# Altium schematic symbol library Schlib.SchLib: 725 symbols (part 3 of 6) (continued)
## FTSH-110-01-L-D-RA
designator J?  (value not drawn)
Conn Unshrouded Header HDR 20 POS 1.27mm Solder RA Side Entry Thru-Hole Tube; Manufacturer: Samtec; Manufacturer Part Number: FTSH-110-01-L-D-RA; Number of Contacts: 20; Gender: Male; Connector Type: Male Pin; Pitch: 0.05inch; Supplier 1: Rs; RoHS: Yes; Category: Connectors; Stock 1: 33; Pricing 1: 1=4.88000, 25=3.39000, 100=3.28000, 250=3.19000, 500=3.11000 (GBP); Mount: Through Hole; Contact Plating: Gold; Contact Material: Bronze; Housing Color: Black; Housing Material: Polymer; Color: Black; Min Operating Temperature: -55°C; Max Operating Temperature: 125°C; Number of Rows: 2; Termination: Solder; Packaging: Rail/Tube; Orientation: Right Angle; Number of Positions: 20; Series: FTSH; Contact Type: Male Pin; Length: 12.7mm; Depth: 8.1mm; Row Spacing: 0.05inch; Contact Mating Length: 0.12inch; Radiation Hardening: No; RoHS Compliant: Yes; Reach SVHC Compliant: Yes; ComponentLink1URL: https://datasheet.ciiva.com/738/ftsh-1xx-xx-xx-d-xx-xx-mkt-738870.pdf?src-supplier=Digi-Key; ComponentLink1Description: https://datasheet.ciiva.com/738/ftsh-1xx-xx-xx-d-xx-xx-mkt-738870.pdf?src-supplier=Digi-Key; Supplier Part Number 1: 1804965
footprint SAMTEC-FTSH-110-01-X-D-RA
pins: 1, 2, 3, 4, 5, 6, 7, 8, 9, 10, 11, 12, 13, 14, 15, 16, 17, 18, 19, 20

## FTSH-112-01-L-D-RA
designator J?  (value not drawn)
Conn Unshrouded Header HDR 24 POS 1.27mm Solder RA Side Entry Thru-Hole Tube; Manufacturer: Samtec; Manufacturer Part Number: FTSH-112-01-L-D-RA; Max Current Rating: 1.75A; Number of Contacts: 24; Gender: Male; Supplier: Digi-Key; Supplier Part Number: FTSH-112-01-L-D-RA-ND; RoHS: Yes; Category: Connectors; Stock: 448; Pricing: 1=6.18000, 10=5.58900, 100=4.89340, 500=4.12080, 1000=3.60570 (USD); Contact Material: Bronze; Contact Plating: Gold; Housing Color: Black; Housing Material: Polymer; Min Operating Temperature: -55°C; Max Operating Temperature: 125°C; Packaging: Rail/Tube; Number of Rows: 2; Termination: Solder; Orientation: Right Angle; Length: 15.24mm; Pitch: 1.27mm; Depth: 8.1mm; Radiation Hardening: No; Reach SVHC Compliant: Yes; RoHS Compliant: Yes; ComponentLink1URL: https://datasheet.ciiva.com/7190/1596288-7190091.pdf?src-supplier=Newark; ComponentLink1Description: https://datasheet.ciiva.com/7190/1596288-7190091.pdf?src-supplier=Newark
footprint FTSH-112-01-L-D-RA
pins: 1, 2, 3, 4, 5, 6, 7, 8, 9, 10, 11, 12, 13, 14, 15, 16, 17, 18, 19, 20, 21, 22, 23, 24

## FUSB301TMX
designator U?  (value not drawn)
Autonomous USB Type-C Controller with Super Speed Switch Control; Manufacturer: ON Semiconductor / Fairchild; Manufacturer Part Number: FUSB301TMX; Supplier: Digikey; Supplier Part Number: 488-FUSB301TMXCT-ND; RoHS: Yes; Category: USB Interface ICs; Stock: 6716; Pricing: 1=1.64, 10=1, 25=0.8412, 100=0.6667, 250=0.5832, 500=0.5327, 1000=0.49097, 2500=0.44669 (USD); ComponentLink1URL: http://www.mouser.com/ds/2/149/FUSB301-838451.pdf?src-supplier=Mouser; ComponentLink1Description: http://www.mouser.com/ds/2/149/FUSB301-838451.pdf?src-supplier=Mouser; ComponentLink2URL: https://www.onsemi.com/pub/Collateral/FUSB301-D.PDF?src-supplier=Digikey; ComponentLink2Description: https://www.onsemi.com/pub/Collateral/FUSB301-D.PDF?src-supplier=Digikey; ComponentLink3URL: https://www.fairchildsemi.com/datasheets/FU/FUSB301.pdf?src-supplier=Digikey; ComponentLink3Description: https://www.fairchildsemi.com/datasheets/FU/FUSB301.pdf?src-supplier=Digikey; ComponentLink4URL: https://datasheet.octopart.com/FUSB301TMX-ON-Semiconductor-datasheet-85553202.pdf?src-supplier=Newark; ComponentLink4Description: https://datasheet.octopart.com/FUSB301TMX-ON-Semiconductor-datasheet-85553202.pdf?src-supplier=Newark
footprint FUSB301TMX
pins: 1 SDA, 2 SCL, 3 ID, 4 GND, 5 VDD, 6 CC1, 7 CC2, 8 VBUS, 9 SS_SW, 10 INT_N

## G125-FV108F3-03AB000P
designator J?
Headers & Wire Housings GeckoMT 8+3 Pos F ScrewLok R Fix; Manufacturer: Harwin; Manufacturer Part Number: G125-FV108F3-03AB000P; Supplier: Digikey; Supplier Part Number: 952-G125-FV108F3-03AB000P-ND; RoHS: No; Stock: 45; Pricing: 1=57.51, 10=48.884, 100=41.5594 (USD)
footprint G125-FV108F3-03AB000P
pins: 1, 2, 3, 4, 5, 6, 7, 8, A (power), B (power), C (power), S1 SCR, S2 SCR

## G125-FV10805F1-2AB2ABP
designator J?
HARWIN Power to the Board FML VRTCL 4PW 8 SIG Connector; Part Number: G125-FV10805F1-2AB2ABP; Value: G125-FV10805F1-2AB2ABP
footprint HARWIN_G125-FV10805F1-2AB2ABP (HARWIN Power to the Board FML VRTCL 4PW 8 SIG Connector)
pins: 1, 2, 3, 4, 5, 6, 7, 8, A (power), B (power), C (power), D (power)

## G125-FV10805F3-1AB1ABP
designator J?
WTB Connector, RCPT, 10POS, 2ROW, 1.25mm;; Manufacturer: Harwin; Manufacturer Part Number: G125-FV10805F3-1AB1ABP; Connector Type: Receptacle; Voltage Rating: 450V; Supplier: Digikey; Supplier Part Number: 952-G125-FV10805F3-1AB1ABP-ND; RoHS: Yes; Category: Connectors; Stock: 3; Pricing: 1=58.67, 10=49.87, 100=42.3976 (USD); Mounting Technology: Through Hole; Contact Material: Copper; Contact Finish - Mating: GOLD; Insulation Color: Green; Insulation Material: Nylon; Contact Shape: Circular; Min Operating Temperature: -65°C; Max Operating Temperature: 150°C; Fastening Type: Screw Lock; Series: Gecko MT Reverse Fix; Contact Type: Female Socket; Termination: Solder; Number of Rows: 2; Flammability Rating: UL94 V-0; ComponentLink1URL: https://cdn.harwin.com/pdfs/C125XX_G125_Gecko_Connectors.pdf?src-supplier=Digikey; ComponentLink1Description: https://cdn.harwin.com/pdfs/C125XX_G125_Gecko_Connectors.pdf?src-supplier=Digikey; ComponentLink2URL: https://datasheet.octopart.com/G125-FV10805F3-1AB1ABP-Harwin-datasheet-153591197.pdf?src-supplier=Element14; ComponentLink2Description: https://datasheet.octopart.com/G125-FV10805F3-1AB1ABP-Harwin-datasheet-153591197.pdf?src-supplier=Element14
footprint G125-FV10805F3-1AB1ABP
pins: 1, 2, 3, 4, 5, 6, 7, 8, A (power), B (power), S1 SCR, S2 SCR

## G125-FV10805F3-2AB2ABP
designator J?
WTB Connector, RCPT, 12POS, 2ROW, 1.25mm;; Manufacturer: Harwin; Manufacturer Part Number: G125-FV10805F3-2AB2ABP; Connector Type: Receptacle; Voltage Rating: 450V; Current Rating: 2.8A; Number of Contacts: 12NUMBER; Supplier: Digikey; Supplier Part Number: 952-G125-FV10805F3-2AB2ABP-ND; RoHS: Yes; Category: Headers and Wire Housings; Stock: 75; Pricing: 1=76.87, 10=65.339, 100=55.5502 (USD); Mounting Technology: Through Hole; Contact Material: Copper; Contact Finish - Mating: GOLD; Insulation Color: Green; Insulation Material: Nylon; Contact Shape: Circular; Min Operating Temperature: -65°C; Max Operating Temperature: 150°C; Fastening Type: Screw Lock; Series: Gecko MT Reverse Fix; Contact Type: Female Socket; Termination: Solder; Number of Rows: 2; Height: 5.45mm; Flammability Rating: UL94 V-0; ComponentLink1URL: https://cdn.harwin.com/pdfs/C125XX_G125_Gecko_Connectors.pdf?src-supplier=Digikey; ComponentLink1Description: https://cdn.harwin.com/pdfs/C125XX_G125_Gecko_Connectors.pdf?src-supplier=Digikey; ComponentLink2URL: https://datasheet.octopart.com/G125-FV10805F3-2AB2ABP-Harwin-datasheet-153591200.pdf?src-supplier=Element14; ComponentLink2Description: https://datasheet.octopart.com/G125-FV10805F3-2AB2ABP-Harwin-datasheet-153591200.pdf?src-supplier=Element14
footprint G125-FV10805F3-2AB2ABP
pins: 1, 2, 3, 4, 5, 6, 7, 8, A (power), B (power), C (power), D (power), S1 SCR, S2 SCR

## G125-MH10605M4P
designator J?  value G125-MH10605M4P
HARWIN 3+3 position MALE screw-lock board mount; Part Number: G125-MH10605M4P
footprint G125-MH10605M4P (HARWIN 3+3 position MALE screw-lock board mount)
pins: 1, 2, 3, 4, 5, 6

## G125-MH10805M4-1AD1ADP
designator J?  value G125-MH10805M4-1AD1ADP  (hidden comment: *)
WTB Connector, HEADER, 10POS, 2ROW, 1.25mm;; Manufacturer: Harwin; Supplier: Mouser; Supplier Part Number: 855-GMH1085M41AD1ADP; Manufacturer Part Number: G125-MH10805M4-1AD1ADP; RoHS: Yes; Category: Connectors; Stock: 205; Pricing: 1=67.64, 10=57.59, 50=56.55, 100=48.96, 1000=48.96, 10000=48.96 (USD)
footprint G125-MH10805M4-1AD1ADP
pins: 1, 2, 3, 4, 5, 6, 7, 8, A (power), B (power), S1, S2

## G125-MH11005M3P
designator J?
HARWIN 5+5 MALE Conn. Screw Lock Mount; Part Number: G125-MH11005M3P
footprint HARWIN_G125-MH11005M3P (HARWIN 5+5 MALE Conn. Screw Lock Mount)
pins: 1, 2, 3, 4, 5, 6, 7, 8, 9, 10

## G125-MH11005M4P
designator J?  value G125-MH11005M4P  (hidden comment: *)
Board Connector, 10 Contact(s), 2 Row(s), Male, Right Angle, 0.05 inch Pitch, Solder Terminal, M2; Manufacturer: Harwin; Supplier: Digikey; Supplier Part Number: 952-G125-MH11005M4P-ND; Manufacturer Part Number: G125-MH11005M4P; RoHS: No; Category: Connectors; Stock: 366; Pricing: 1=21.1, 10=18.478, 100=16.5386, 500=15.16988 (USD)
footprint G125-MH11005M4P
pins: 1, 2, 3, 4, 5, 6, 7, 8, 9, 10, S1 SCR, S2 SCR

## G125-MH11205M4P
designator J?
HARWIN 6+6 Pos Male Connector Screw-Lock Board Mount; Part Number: G125-MH11205M4P
footprint HARWIN_G125-MH11205M4P (HARWIN 6+6 Pos Male Connector Screw-Lock Board Mount)
pins: 1, 2, 3, 4, 5, 6, 7, 8, 9, 10, 11, 12

## G125-MH12005M4P
designator J?
Conn Shrouded Header (4 Sides) HDR 20 POS 1.25mm Solder RA Thru-Hole T/R; Manufacturer: Harwin; Manufacturer Part Number: G125-MH12005M4P; Number of Positions: 20; Voltage Rating: 450V; Supplier: Digikey; Supplier Part Number: 952-G125-MH12005M4P-ND; RoHS: Yes; Category: Connectors; Stock: 479; Pricing: 1=22.74, 10=19.913, 100=17.823, 500=16.34796 (USD); Mounting Technology: Through Hole; Contact Material: Bronze; Contact Shape: Circular; Contact Finish - Mating: GOLD; Insulation Material: Nylon; Insulation Color: Green; Min Operating Temperature: -65°C; Max Operating Temperature: 150°C; Connector Type: Header; Fastening Type: Screw Lock; Series: Gecko SL; Contact Type: Male Pin; Number of Rows: 2; Termination: Solder; Flammability Rating: UL94 V-0
footprint G125-MH12005M4P
pins: 1, 2, 3, 4, 5, 6, 7, 8, 9, 10 19, 11, 12, 13, 14, 15, 16, 17, 18, 19, 20, S1 SCR, S2 SCR
text: 90`

## G125-MH12605L1P
designator J?  value G125-MH12605L1P
Gecko DIL Male Horizontal 3.3mm Throughboard Connector, Latches for 1.6mm thick PCB, gold, pick & place (cut tape packing), 13+13 contacts; Part Number: G125-MH12605L1P
footprint HARWIN_G125-MH12605L1P (Gecko DIL Male Horizontal 3.3mm Throughboard Connector, Latches for 1.6mm thick PCB, gold, pick & place (cut tape packing), 13+13 contacts)
pins: 1, 2, 3, 4, 5, 6, 7, 8, 9, 10, 11, 12, 13, 14, 15, 16, 17, 18, 19, 20, 21, 22, 23, 24, 25, 26

## G125-MV11005M2P
designator J?  value G125-MV11005M2P
HARWIN Male Vertical Connector, 1.25mm Pitch, 5+5 Contacts; Part Number: G125-MV11005M2P
footprint G125-MV11005M2P (HARWIN Male Vertical Connector, 1.25mm Pitch, 5+5 Contacts)
pins: 1, 2, 3, 4, 5, 6, 7, 8, 9, 10

## G125-MV11205M2P
designator J?  value G125-MV11205M2P
HARWIN Male vertical Connector, 1.25mm pitch, 6+6 contacts; Part Number: G125-MV11205M2P
footprint G125-MV11205M2P (HARWIN Male vertical Connector, 1.25mm pitch, 6+6 contacts)
pins: 1, 2, 3, 4, 5, 6, 7, 8, 9, 10, 11, 12

## G125-MV12005M2P
designator J?
Board Connector, 20 Contact(s), 2 Row(s), Male, Straight, 0.049 inch Pitch, Solder Terminal, Locking; Manufacturer: Harwin; Manufacturer Part Number: G125-MV12005M2P; Connector Type: Header; Number of Positions: 20; Voltage Rating: 450V; Mated Stacking Heights: 7.8mm; Supplier: Digikey; Supplier Part Number: 952-3672-ND; RoHS: Yes; Category: Headers and Wire Housings; Stock: 275; Pricing: 1=14.2, 10=12.069, 100=10.2586, 500=9.15818, 1000=8.72167 (USD); Mounting Technology: Through Hole; Contact Material: Bronze; Contact Shape: Circular; Insulation Material: Nylon; Contact Finish - Mating: GOLD; Insulation Color: Green; Min Operating Temperature: -65°C; Max Operating Temperature: 150°C; Fastening Type: Threaded; Packaging: Bulk; Number of Rows: 2; Termination: Solder; Series: Gecko SL; Contact Type: Male Pin; RoHS Compliant: Yes; Flammability Rating: UL94 V-0; ComponentLink1URL: https://cdn.harwin.com/pdfs/Harwin_PC_Gecko.pdf?src-supplier=Digikey; ComponentLink1Description: https://cdn.harwin.com/pdfs/Harwin_PC_Gecko.pdf?src-supplier=Digikey
footprint G125-MV12005M2P (HARWIN Male Vertical Connector, 1.25mm Pitch, 10+10 contacts)
pins: 1, 2, 3, 4, 5, 6, 7, 8, 9, 10 19, 11, 12, 13, 14, 15, 16, 17, 18, 19, 20, S1 SCR, S2 SCR

## G861AB04221T2EU
designator J?  (value not drawn)
WAFER 2.54MM PITCH STR DIP,1X4PI; Manufacturer: Amphenol; Manufacturer Part Number: G861AB04221T2EU; Supplier: Digikey; Supplier Part Number: 664-G861AB04221T2EU-ND; RoHS: No; Category: Connectors; Stock: 10281; Pricing: 1=0.44, 10=0.371, 100=0.3152, 500=0.28128, 1000=0.26784, 5000=0.23908, 10000=0.22767 (USD)
footprint G861AB04221T2EU
pins: 1, 2, 3, 4

## GCJ188R71E105KA01J
designator C?  value 1uF  (hidden comment: *)
Cap Ceramic 1uF 25V X7R 10% SMD 0603 125°C Paper T/R; Manufacturer: Murata; Manufacturer Part Number: GCJ188R71E105KA01J; Supplier: Digi-Key; Supplier Part Number: 490-GCJ188R71E105KA01JCT-ND; RoHS: Yes; Category: Ceramic Capacitors; Stock: 21709; Pricing: 1=0.26000, 10=0.17700, 50=0.10640, 100=0.08980, 500=0.06144, 1000=0.05436, 2500=0.05200, 5000=0.04727 (USD); RoHS Compliant: Yes; Case/Package: 0603
footprint C 0603 (1608 Metric)
pins: 1 B, 2 A

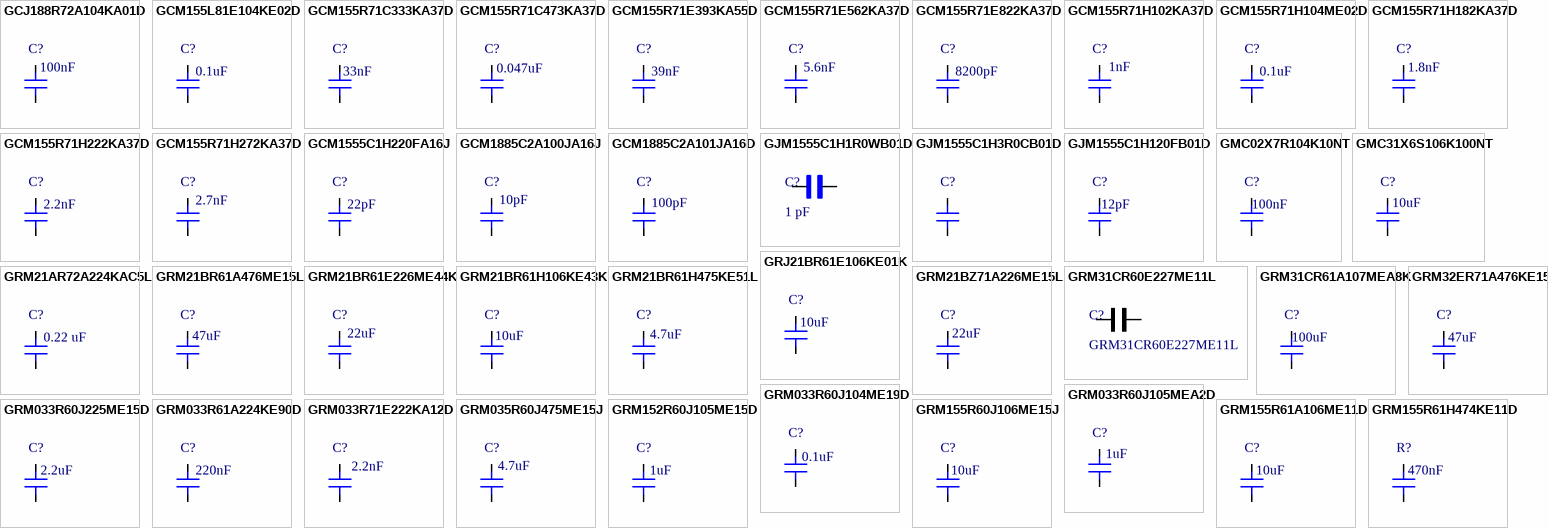
[diagram p11: symbols GCJ188R72A104KA01D to GRM155R61H474KE11D]

## GCJ188R72A104KA01D
designator C?  value 100nF  (hidden comment: *)
Cap Ceramic 0.1uF 100V X7R 10% Pad SMD 0603 Soft Termination 125C Automotive T/R; Manufacturer: Murata; Manufacturer Part Number: GCJ188R72A104KA01D; Material: 4241ConductorMaterial; Supplier: Future Electronics; Supplier Part Number: 7079294; RoHS: Yes; Category: Ceramic Capacitors; Stock: 116000; Pricing: 4000=0.0239, 12000=0.023, 20000=0.0226, 40000=0.0221, 80000=0.0212 (USD); Mounting Technology: Surface Mount; Case/Package: 0603; Case Code (Metric): 1608; Case Code (Imperial): 0603; Min Operating Temperature: -55°C; Max Operating Temperature: 125°C; Packaging: Cut Tape; Voltage Rating: 100V; Tolerance: 10%; Features: Soft Termination; Series: GCJ; Length: 0.063inch; Width: 0.031inch; Height: 900um; Thickness: 0.035inch; Ratings: AEC-Q200; RoHS Compliant: Yes; Lead Free: 5697LeadFree; ComponentLink1URL: https://datasheet.octopart.com/GCJ188R72A104KA01D-Murata-datasheet-78375067.pdf?src-supplier=Future+Electronics; ComponentLink1Description: https://datasheet.octopart.com/GCJ188R72A104KA01D-Murata-datasheet-78375067.pdf?src-supplier=Future+Electronics; ComponentLink2URL: http://search.murata.co.jp/Ceramy/image/img/A01X/partnumbering_e_02.pdf?src-supplier=Digikey; ComponentLink2Description: http://search.murata.co.jp/Ceramy/image/img/A01X/partnumbering_e_02.pdf?src-supplier=Digikey; ComponentLink3URL: https://www.murata.com/~/media/webrenewal/support/library/catalog/products/capacitor/mlcc/c03e.ashx?la=en-us&src-supplier=Digikey; ComponentLink3Description: https://www.murata.com/~/media/webrenewal/support/library/catalog/products/capacitor/mlcc/c03e.ashx?la=en-us&src-supplier=Digikey; ComponentLink4URL: https://datasheet.octopart.com/GCJ188R72A104KA01D-Murata-datasheet-165611796.pdf?src-supplier=TME; ComponentLink4Description: https://datasheet.octopart.com/GCJ188R72A104KA01D-Murata-datasheet-165611796.pdf?src-supplier=TME
footprint C 0603 (1608 Metric)
pins: 1 B, 2 A

## GCM155L81E104KE02D
designator C?  value 0.1uF  (hidden comment: *)
0402 0.1 uF 25 V ±10% Tolerance X8L Surface Mount Multilayer Ceramic Capacitor; Manufacturer: Murata; Manufacturer Part Number: GCM155L81E104KE02D; Supplier: Digi-Key; Supplier Part Number: 490-18203-6-ND; RoHS: Yes; Category: Ceramic Capacitors; Stock: 32810; Pricing: 1=0.10000, 10=0.04000, 50=0.02180, 100=0.01780, 500=0.01272, 1000=0.01000, 2500=0.00909, 5000=0.00836 (USD); RoHS Compliant: Yes; ComponentLink1URL: https://psearch.en.murata.com/capacitor/product/GCM155L81E104KE02%23.pdf?src-supplier=Digi-Key; ComponentLink1Description: https://psearch.en.murata.com/capacitor/product/GCM155L81E104KE02%23.pdf?src-supplier=Digi-Key; Case/Package: 0402
footprint C 0402 (1005 Metric) (Chip Capacitor, Body 1.0x0.5mm, IPC High Density)
pins: 1 B, 2 A

## GCM155R71C333KA37D
designator C?  value 33nF  (hidden comment: *)
0402 16 V 0.033 uF ±10% Tolerance X7R Multilayer Ceramic Capacitor; Manufacturer: Murata; Manufacturer Part Number: GCM155R71C333KA37D; Material: 4241ConductorMaterial; Supplier: Mouser; Supplier Part Number: 81-GCM155R71C333KA7D; RoHS: Yes; Category: Ceramic Capacitors; Stock: 56799; Pricing: 1=0.1, 10=0.016, 50=0.016, 100=0.01, 1000=0.008, 10000=0.007 (USD); ComponentLink1URL: https://datasheet.ciiva.com/11605/product-11605431.pdf?src-supplier=Avnet; ComponentLink1Description: https://datasheet.ciiva.com/11605/product-11605431.pdf?src-supplier=Avnet; ComponentLink2URL: https://datasheet.ciiva.com/164/s0717e-164239.pdf?src-supplier=Digikey; ComponentLink2Description: https://datasheet.ciiva.com/164/s0717e-164239.pdf?src-supplier=Digikey; Case/Package: 0402
footprint C 0402 (1005 Metric) (Chip Capacitor, Body 1.0x0.5mm, IPC High Density)
pins: 1 B, 2 A

## GCM155R71C473KA37D
designator C?  value 0.047uF  (hidden comment: *)
Multilayer Ceramic Capacitor, 0.047 uF, 16 V, ± 10%, X7R, 0402 [1005 Metric]; Manufacturer: Murata; Manufacturer Part Number: GCM155R71C473KA37D; Material: 4241ConductorMaterial; Supplier: Arrow Electronics; Supplier Part Number: GCM155R71C473KA37D; RoHS: Yes; Category: Ceramic Capacitors; Stock: 240000; Pricing: 10000=0.0081, 20000=0.008, 50000=0.0071, 100000=0.006, 250000=0.0059 (USD); ComponentLink1URL: https://datasheet.ciiva.com/11607/product-11607786.pdf?src-supplier=Avnet; ComponentLink1Description: https://datasheet.ciiva.com/11607/product-11607786.pdf?src-supplier=Avnet; ComponentLink2URL: https://datasheet.ciiva.com/6270/s0717e-6270764.pdf?src-supplier=Digikey; ComponentLink2Description: https://datasheet.ciiva.com/6270/s0717e-6270764.pdf?src-supplier=Digikey; ComponentLink3URL: https://datasheet.ciiva.com/6270/s0717e-6270765.pdf?src-supplier=Digikey; ComponentLink3Description: https://datasheet.ciiva.com/6270/s0717e-6270765.pdf?src-supplier=Digikey; ComponentLink4URL: https://datasheet.ciiva.com/6270/s0717e-6270766.pdf?src-supplier=Digikey; ComponentLink4Description: https://datasheet.ciiva.com/6270/s0717e-6270766.pdf?src-supplier=Digikey; Case/Package: 0402
footprint C 0402 (1005 Metric) (Chip Capacitor, Body 1.0x0.5mm, IPC High Density)
pins: 1 B, 2 A

## GCM155R71E393KA55D
designator C?  value 39nF  (hidden comment: *)
Multilayer Ceramic Capacitor, 0.039 uF, 25 V, ± 10%, X7R, 0402 [1005 Metric]; Manufacturer: Murata; Manufacturer Part Number: GCM155R71E393KA55D; Material: 4241ConductorMaterial; Voltage Rating: 25V; Supplier: Mouser; Supplier Part Number: 81-GCM155R71E393KA5D; RoHS: Yes; Category: Ceramic Capacitors; Stock: 35903; Pricing: 1=0.1, 10=0.024, 50=0.024, 100=0.014, 1000=0.01, 10000=0.006 (USD); Width: 500um; Thickness: 500um; ComponentLink1URL: https://datasheet.octopart.com/GCM155R71E393KA55D-Murata-datasheet-149522460.pdf?src-supplier=Newark; ComponentLink1Description: https://datasheet.octopart.com/GCM155R71E393KA55D-Murata-datasheet-149522460.pdf?src-supplier=Newark; ComponentLink2URL: https://datasheet.octopart.com/GCM155R71E393KA55D-Murata-datasheet-12511495.pdf?src-supplier=TME; ComponentLink2Description: https://datasheet.octopart.com/GCM155R71E393KA55D-Murata-datasheet-12511495.pdf?src-supplier=TME; Case/Package: 0402
footprint C 0402 (1005 Metric) (Chip Capacitor, Body 1.0x0.5mm, IPC High Density)
pins: 1 B, 2 A

## GCM155R71E562KA37D
designator C?  value 5.6nF  (hidden comment: *)
Multilayer Ceramic Capacitor, 5600 pF, 25 V, ± 10%, X7R, 0402 [1005 Metric]; Manufacturer: Murata; Manufacturer Part Number: GCM155R71E562KA37D; Supplier: Mouser; Supplier Part Number: 81-GCM155R71E562KA7D; RoHS: Yes; Category: Ceramic Capacitors; Stock: 48359; Pricing: 1=0.1, 10=0.01, 50=0.01, 100=0.006, 1000=0.005, 10000=0.003 (USD); RoHS Compliant: Yes; Case/Package: 0402
footprint C 0402 (1005 Metric) (Chip Capacitor, Body 1.0x0.5mm, IPC High Density)
pins: 1 B, 2 A

## GCM155R71E822KA37D
designator C?  value 8200pF  (hidden comment: *)
Multilayer Ceramic Capacitors 0.0082uF 25V X7R 10% Pad SMD 0402 125°C; Manufacturer: Murata; Manufacturer Part Number: GCM155R71E822KA37D; Supplier: Digi-Key; Supplier Part Number: 490-GCM155R71E822KA37DCT-ND; RoHS: Yes; Category: Ceramic Capacitors; Stock: 9710; Pricing: 1=0.10000, 10=0.02000, 50=0.01100, 100=0.00890, 500=0.00636, 1000=0.00500, 2500=0.00454, 5000=0.00418 (USD); RoHS Compliant: Yes; Case/Package: 0402
footprint C 0402 (1005 Metric) (Chip Capacitor, Body 1.0x0.5mm, IPC High Density)
pins: 1 B, 2 A

## GCM155R71H102KA37D
designator C?  value 1nF  (hidden comment: *)
Multilayer Ceramic Capacitor, 1000 pF, 50 V, ± 10%, X7R, 0402 [1005 Metric]; Manufacturer: Murata; Manufacturer Part Number: GCM155R71H102KA37D; Material: 4241ConductorMaterial; Voltage Rating: 50V; Supplier: Rs; Supplier Part Number: 7234950P; RoHS: Yes; Category: Ceramic Capacitors; Stock: 9800; Pricing: 400=1.045, 4000=0.675, 6000=0.495, 8000=0.31 (JPY); Mounting Technology: Surface Mount; Case/Package: 0402; Case Code (Metric): 1005; Case Code (Imperial): 0402; Min Operating Temperature: -55°C; Max Operating Temperature: 125°C; Package Quantity: 1; Tolerance: 10%; Packaging: Tape and Reel; Voltage Rating (DC): 50V; Dielectric: X7R; Termination: SMD/SMT; Voltage: 50V; Series: GCM; Construction: Flat; Length: 1mm; Width: 0.02inch; Height: 0.5mm; Thickness: 0.022inch; Depth: 0.5mm; Ratings: AEC-Q200; Radiation Hardening: No; Reach SVHC Compliant: No; Lead Free: Lead Free; RoHS Compliant: Yes; ComponentLink1URL: https://datasheet.ciiva.com/11786/0900766b80ef92d0-11786143.pdf?src-supplier=Rs; ComponentLink1Description: https://datasheet.ciiva.com/11786/0900766b80ef92d0-11786143.pdf?src-supplier=Rs; ComponentLink2URL: https://datasheet.ciiva.com/16213/product-16213384.pdf?src-supplier=Future+Electronics; ComponentLink2Description: https://datasheet.ciiva.com/16213/product-16213384.pdf?src-supplier=Future+Electronics
footprint C 0402 (1005 Metric) (Chip Capacitor, Body 1.0x0.5mm, IPC High Density)
pins: 1 B, 2 A

## GCM155R71H104ME02D
designator C?  value 0.1uF  (hidden comment: *)
Cap Ceramic 0.1uF 50V X7R 20% Pad SMD 0402 125C Automotive T/R; Manufacturer: Murata; Manufacturer Part Number: GCM155R71H104ME02D; Supplier: Digi-Key; Supplier Part Number: 490-18204-1-ND; RoHS: Yes; Category: Ceramic Capacitors; Stock: 609694; Pricing: 1=0.10000, 10=0.03800, 50=0.02060, 100=0.01680, 500=0.01202, 1000=0.00944, 2500=0.00858, 5000=0.00790 (USD); RoHS Compliant: Yes; Case/Package: 0402
footprint C 0402 (1005 Metric) (Chip Capacitor, Body 1.0x0.5mm, IPC High Density)
pins: 1 B, 2 A

## GCM155R71H182KA37D
designator C?  value 1.8nF  (hidden comment: *)
Multilayer Ceramic Capacitor, 1800 pF, 50 V, ± 10%, X7R, 0402 [1005 Metric]; Manufacturer: Murata; Manufacturer Part Number: GCM155R71H182KA37D; Material: 4241ConductorMaterial; Voltage Rating: 50V; Supplier: Future Electronics; Supplier Part Number: 9118082; RoHS: Yes; Category: Ceramic Capacitors; Stock: 10000; Pricing: 10000=0.0029, 40000=0.0027, 150000=0.0026, 250000=0.0025, 500000=0.0024 (USD); Mounting Technology: Surface Mount; Case/Package: 0402; Case Code (Imperial): 0402; Case Code (Metric): 1005; Min Operating Temperature: -55°C; Max Operating Temperature: 125°C; Packaging: Cut Tape; Tolerance: 10%; Series: GCM; Length: 1mm; Width: 500um; Height: 550um; Thickness: 500um; Ratings: AEC-Q200; RoHS Compliant: Yes; ComponentLink1URL: http://search.murata.co.jp/Ceramy/image/img/A01X/partnumbering_e_02.pdf?src-supplier=Digikey; ComponentLink1Description: http://search.murata.co.jp/Ceramy/image/img/A01X/partnumbering_e_02.pdf?src-supplier=Digikey; ComponentLink2URL: http://search.murata.co.jp/Ceramy/image/img/A01X/G101/ENG/GCM155R71H182KA37-01.pdf?src-supplier=Digikey; ComponentLink2Description: http://search.murata.co.jp/Ceramy/image/img/A01X/G101/ENG/GCM155R71H182KA37-01.pdf?src-supplier=Digikey; ComponentLink3URL: https://datasheet.octopart.com/GCM155R71H182KA37D-Murata-datasheet-149522486.pdf?src-supplier=Newark; ComponentLink3Description: https://datasheet.octopart.com/GCM155R71H182KA37D-Murata-datasheet-149522486.pdf?src-supplier=Newark; ComponentLink4URL: https://datasheet.octopart.com/GCM155R71H182KA37D-Murata-datasheet-12511495.pdf?src-supplier=TME; ComponentLink4Description: https://datasheet.octopart.com/GCM155R71H182KA37D-Murata-datasheet-12511495.pdf?src-supplier=TME
footprint C 0402 (1005 Metric) (Chip Capacitor, Body 1.0x0.5mm, IPC High Density)
pins: 1 B, 2 A

## GCM155R71H222KA37D
designator C?  value 2.2nF  (hidden comment: *)
Multilayer Ceramic Capacitor, 2200 pF, 50 V, ± 10%, X7R, 0402 [1005 Metric]; Manufacturer: Murata; Manufacturer Part Number: GCM155R71H222KA37D; Material: 4241ConductorMaterial; Voltage Rating: 50V; Supplier: Future Electronics; Supplier Part Number: 7052250; RoHS: Yes; Category: Ceramic Capacitors; Stock: 80000; Pricing: 10000=0.0029, 40000=0.0027, 150000=0.0026, 250000=0.0025, 500000=0.0024 (USD); Mounting Technology: Surface Mount; Case/Package: 0402; Case Code (Metric): 1005; Case Code (Imperial): 0402; Weight: 2.3E-05oz; Min Operating Temperature: -55°C; Max Operating Temperature: 125°C; Packaging: Tape and Reel; Tolerance: 10%; Package Quantity: 1; Voltage Rating (DC): 50V; Dielectric: X7R; Termination: SMD/SMT; Voltage: 50V; Series: GCM; Construction: Flat; Length: 1mm; Width: 0.02inch; Height: 0.5mm; Thickness: 0.022inch; Depth: 0.5mm; Ratings: AEC-Q200; Radiation Hardening: No; RoHS Compliant: Yes; Lead Free: 5697LeadFree; ComponentLink1URL: https://datasheet.ciiva.com/130/product-130809.pdf?src-supplier=Digikey; ComponentLink1Description: https://datasheet.ciiva.com/130/product-130809.pdf?src-supplier=Digikey; ComponentLink2URL: https://datasheet.ciiva.com/130/product-130808.pdf?src-supplier=Digikey; ComponentLink2Description: https://datasheet.ciiva.com/130/product-130808.pdf?src-supplier=Digikey; ComponentLink3URL: https://datasheet.ciiva.com/130/product-130810.pdf?src-supplier=Digikey; ComponentLink3Description: https://datasheet.ciiva.com/130/product-130810.pdf?src-supplier=Digikey; ComponentLink4URL: https://datasheet.ciiva.com/11620/product-11620577.pdf?src-supplier=Avnet; ComponentLink4Description: https://datasheet.ciiva.com/11620/product-11620577.pdf?src-supplier=Avnet; ComponentLink5URL: https://datasheet.ciiva.com/26889/getdatasheetpartid-692458-26889132.pdf?src-supplier=Verical; ComponentLink5Description: https://datasheet.ciiva.com/26889/getdatasheetpartid-692458-26889132.pdf?src-supplier=Verical
footprint C 0402 (1005 Metric) (Chip Capacitor, Body 1.0x0.5mm, IPC High Density)
pins: 1 B, 2 A

## GCM155R71H272KA37D
designator C?  value 2.7nF  (hidden comment: *)
Multilayer Ceramic Capacitor, 2700 pF, 50 V, ± 10%, X7R, 0402 [1005 Metric]; Manufacturer: Murata; Manufacturer Part Number: GCM155R71H272KA37D; Material: 4241ConductorMaterial; Voltage Rating: 50V; Supplier: Digikey; Supplier Part Number: 490-GCM155R71H272KA37DCT-ND; RoHS: Yes; Category: Ceramic Capacitors; Stock: 57332; Pricing: 1=0.1, 10=0.02, 50=0.0118, 100=0.0091, 500=0.00684, 1000=0.00538, 2500=0.00489, 5000=0.0045 (USD); Mounting Technology: Surface Mount; Case/Package: 0402; Min Operating Temperature: -55°C; Max Operating Temperature: 125°C; Tolerance: 10%; Series: GCM; Length: 1mm; Width: 500um; Height: 550um; Thickness: 500um; Ratings: AEC-Q200; RoHS Compliant: Yes; ComponentLink1URL: http://search.murata.co.jp/Ceramy/image/img/A01X/G101/ENG/GCM155R71H272KA37-01.pdf?src-supplier=Digikey; ComponentLink1Description: http://search.murata.co.jp/Ceramy/image/img/A01X/G101/ENG/GCM155R71H272KA37-01.pdf?src-supplier=Digikey
footprint C 0402 (1005 Metric) (Chip Capacitor, Body 1.0x0.5mm, IPC High Density)
pins: 1 B, 2 A

## GCM1555C1H220FA16J
designator C?  value 22pF  (hidden comment: *)
Cap Ceramic 22pF 50V C0G 1% Pad SMD 0402 125C Automotive T/R; Manufacturer: Murata; Manufacturer Part Number: GCM1555C1H220FA16J; Material: 4241ConductorMaterial; Temperature Coefficient: 30ppm/°C; Supplier: Mouser; Supplier Part Number: 81-GCM1555C1H220FA6J; RoHS: Yes; Category: Ceramic Capacitors; Stock: 64515; Pricing: 1=0.1, 10=0.034, 50=0.034, 100=0.022, 1000=0.018, 10000=0.013 (USD); Case/Package: 0402; Min Operating Temperature: -55°C; Max Operating Temperature: 125°C; Voltage Rating: 50V; Length: 1mm; Width: 500um; Height: 550um; Thickness: 500um; RoHS Compliant: Yes
footprint C 0402 (1005 Metric) (Chip Capacitor, Body 1.0x0.5mm, IPC High Density)
pins: 1 B, 2 A

## GCM1885C2A100JA16J
designator C?  value 10pF  (hidden comment: *)
Multilayer Ceramic Capacitor, 10 pF, 100 V, ± 5%, C0G (NP0), 0603 [1608 Metric]; Manufacturer: Murata; Manufacturer Part Number: GCM1885C2A100JA16J; Material: 4241ConductorMaterial; Voltage Rating: 100V; Temperature Coefficient: 30ppm/°C; Supplier: Mouser; Supplier Part Number: 81-GCM1885C2A100JA6J; RoHS: Yes; Category: Ceramic Capacitors; Stock: 22276; Pricing: 1=0.1, 10=0.045, 50=0.045, 100=0.026, 1000=0.02, 10000=0.014 (USD); Mounting Technology: Surface Mount; Case/Package: 0603; Case Code (Imperial): 0603; Case Code (Metric): 1608; Min Operating Temperature: -55°C; Max Operating Temperature: 125°C; Package Quantity: 10000; Tolerance: 5%; Packaging: Tape and Reel; Dielectric: C0G; Termination: SMD/SMT; Voltage Rating (DC): 100V; Series: GCM; Construction: Flat; Length: 1.6mm; Width: 800um; Height: 0.8mm; Depth: 0.8mm; Thickness: 800um; Radiation Hardening: No; RoHS Compliant: Yes; ComponentLink1URL: https://datasheet.ciiva.com/11607/product-11607387.pdf?src-supplier=Avnet; ComponentLink1Description: https://datasheet.ciiva.com/11607/product-11607387.pdf?src-supplier=Avnet
footprint C 0603 (1608 Metric)
pins: 1 B, 2 A

## GCM1885C2A101JA16D
designator C?  value 100pF  (hidden comment: *)
0603 100 pF 100 V ±5 % Tolerance C0G SMT Multilayer Ceramic Capacitor; Manufacturer: Murata; Manufacturer Part Number: GCM1885C2A101JA16D; Tolerance: 5%; Voltage Rating: 100V; Supplier: Rs; Supplier Part Number: 8151323P; RoHS: Yes; Category: Ceramic Capacitors; Stock: 21400; Pricing: 1000=0.015, 2000=0.014, 5000=0.013, 10000=0.012 (GBP); Mounting Technology: Surface Mount; Case/Package: 0603; Case Code (Imperial): 0603; Case Code (Metric): 1608; Min Operating Temperature: -55°C; Max Operating Temperature: 125°C; Dielectric: C0G; Packaging: Tape and Reel; Package Quantity: 1; Voltage Rating (DC): 100V; Termination: SMD/SMT; Voltage: 100V; Series: GCM; Construction: Flat; Length: 1.6mm; Width: 0.031inch; Height: 0.8mm; Thickness: 0.035inch; Depth: 0.8mm; Ratings: AEC-Q200; Radiation Hardening: No; Lead Free: Lead Free; RoHS Compliant: Yes; ComponentLink1URL: https://datasheet.ciiva.com/133/product-133310.pdf?src-supplier=Digi-Key; ComponentLink1Description: https://datasheet.ciiva.com/133/product-133310.pdf?src-supplier=Digi-Key; ComponentLink2URL: https://datasheet.ciiva.com/133/product-133309.pdf?src-supplier=Digi-Key; ComponentLink2Description: https://datasheet.ciiva.com/133/product-133309.pdf?src-supplier=Digi-Key; ComponentLink3URL: https://datasheet.ciiva.com/133/product-133311.pdf?src-supplier=Digi-Key; ComponentLink3Description: https://datasheet.ciiva.com/133/product-133311.pdf?src-supplier=Digi-Key; ComponentLink4URL: https://datasheet.ciiva.com/18183/getdatasheetpartid-223913-18183585.pdf?src-supplier=Verical; ComponentLink4Description: https://datasheet.ciiva.com/18183/getdatasheetpartid-223913-18183585.pdf?src-supplier=Verical; ComponentLink5URL: https://datasheet.ciiva.com/11605/product-11605527.pdf?src-supplier=Avnet; ComponentLink5Description: https://datasheet.ciiva.com/11605/product-11605527.pdf?src-supplier=Avnet
footprint C 0603 (1608 Metric)
pins: 1 B, 2 A

## GJM1555C1H1R0WB01D
designator C?, comment 1 pF
0402 50 V 1 pF ±0.05 pF Tolerance C0G Multilayer Ceramic Capacitor; Manufacturer Part Number: GJM1555C1H1R0WB01D
footprint CAPC1005X55N
pins: 1, 2

## GJM1555C1H3R0CB01D
designator C?  (value not drawn)
0402 3 pF 50V ±0.25 pF Tolerance C0G SMT Multilayer Ceramic Capacitor; Manufacturer: Murata; Manufacturer Part Number: GJM1555C1H3R0CB01D; Value: 3pF; Supplier: Rs; Supplier Part Number: 8151601P; RoHS: Yes; Category: Ceramic Capacitors; Stock: 250; Pricing: 500=1.996, 5000=1.388, 6500=1.084, 7500=0.78 (JPY); Mounting Technology: Surface Mount; Case/Package: 0402; Case Code (Metric): 1005; Case Code (Imperial): 0402; Min Operating Temperature: -55°C; Max Operating Temperature: 125°C; Packaging: Tape and Reel; Package Quantity: 1; Voltage Rating: 50V; Dielectric: C0G; Voltage Rating (DC): 50V; Termination: SMD/SMT; Voltage: 50V; Series: GJM; Construction: Flat; Length: 1mm; Width: 0.02inch; Height: 0.5mm; Thickness: 0.022inch; Depth: 0.5mm; Radiation Hardening: No; Lead Free: Lead Free; RoHS Compliant: Yes; ComponentLink1URL: https://datasheet.ciiva.com/132/product-132424.pdf?src-supplier=Digikey; ComponentLink1Description: https://datasheet.ciiva.com/132/product-132424.pdf?src-supplier=Digikey; ComponentLink2URL: https://datasheet.ciiva.com/132/partnumbering-e-01-132425.pdf?src-supplier=Digikey; ComponentLink2Description: https://datasheet.ciiva.com/132/partnumbering-e-01-132425.pdf?src-supplier=Digikey; ComponentLink3URL: https://datasheet.ciiva.com/132/partnumbering-e-01-132426.pdf?src-supplier=Digikey; ComponentLink3Description: https://datasheet.ciiva.com/132/partnumbering-e-01-132426.pdf?src-supplier=Digikey
footprint C 0402 (1005 Metric) (Chip Capacitor, Body 1.0x0.5mm, IPC High Density)
pins: 1 B, 2 A

## GJM1555C1H120FB01D
designator C?  value 12pF  (hidden comment: *)
Multilayer Ceramic Capacitor, 12 pF, 50 V, ± 1%, C0G (NP0), 0402 [1005 Metric]; Manufacturer: Murata; Manufacturer Part Number: GJM1555C1H120FB01D; Material: 4241ConductorMaterial; Temperature Coefficient: 30ppm/°C; Supplier: Mouser; Supplier Part Number: 81-GJM1555C1H120FB1D; RoHS: Yes; Category: Ceramic Capacitors; Stock: 50440; Pricing: 1=0.13, 10=0.053, 50=0.053, 100=0.031, 1000=0.026, 10000=0.019 (USD); ComponentLink1URL: https://datasheet.ciiva.com/5433/product-5433927.pdf?src-supplier=Mouser; ComponentLink1Description: https://datasheet.ciiva.com/5433/product-5433927.pdf?src-supplier=Mouser; ComponentLink2URL: https://datasheet.ciiva.com/11608/c02e-11608281.pdf?src-supplier=Avnet; ComponentLink2Description: https://datasheet.ciiva.com/11608/c02e-11608281.pdf?src-supplier=Avnet; Case/Package: 0402
footprint C 0402 (1005 Metric) (Chip Capacitor, Body 1.0x0.5mm, IPC High Density)
pins: 1 B, 2 A

## GMC02X7R104K10NT
designator C?  value 100nF  (hidden comment: *)
Ceramic Capacitor, Multilayer, Ceramic, 10V, 10% +Tol, 10% -Tol, X7R, 15% TC, 0.1uF, Surface Mount, 0201; Manufacturer: Cal-Chip Electronics; Manufacturer Part Number: GMC02X7R104K10NT; Supplier: DigiKey; Supplier Part Number: 4713-GMC02X7R104K10NTCT-ND; RoHS: Compliant; Category: Ceramic Capacitors; Stock: 1793015; Pricing: 1=0.1, 10=0.028, 50=0.0186, 100=0.0158, 500=0.0112, 1000=0.00978, 2500=0.0083, 5000=0.00741 (USD); China RoHS: Compliant; Dielectric Material: Ceramic; Height: 330µm; Length: 600µm; Lifecycle Status: Production; Max Operating Temperature: 125°C; Min Operating Temperature: -55°C; Mounting Technology: Surface Mount; Number of Terminals: 2; REACH SVHC: Yes; Voltage Rating (DC): 10V; Width: 300µm; ComponentLink1URL: https://datasheet.octopart.com:443/GMC02X7R104K10NT-Cal-Chip-Electronics-datasheet-182028815.pdf?src-supplier=IHS; ComponentLink1Description: https://datasheet.octopart.com:443/GMC02X7R104K10NT-Cal-Chip-Electronics-datasheet-182028815.pdf?src-supplier=IHS; Case/Package: 0201
footprint C 0201 (0603 Metric)
pins: 1 B, 2 A

## GMC31X6S106K100NT
designator C?  value 10uF  (hidden comment: *)
Cap Cer 10UF 100V X6S 1206; Manufacturer: Cal-Chip Electronics; Manufacturer Part Number: GMC31X6S106K100NT; Supplier: Digikey; Supplier Part Number: 4713-GMC31X6S106K100NTCT-ND; RoHS: No; Category: Ceramic Capacitors; Stock: 13832; Pricing: 1=1.73, 10=1.1, 50=0.8452, 100=0.7659, 500=0.63042, 1000=0.58809 (USD); Case/Package: 1206
footprint C 1206
pins: 1 B, 2 A

## GRJ21BR61E106KE01K
designator C?  value 10uF  (hidden comment: *)
0805 25V X5R 10uF 10% multilayer ceramic capacitor; Manufacturer: Murata; Manufacturer Part Number: GRJ21BR61E106KE01K; Supplier: Digi-Key; Supplier Part Number: 490-GRJ21BR61E106KE01KCT-ND; RoHS: Yes; Category: Ceramic Capacitors; Stock: 139807; Pricing: 1=0.21000, 10=0.14200, 50=0.08500, 100=0.07180, 500=0.04910, 1000=0.04344, 2500=0.04155, 5000=0.03777 (USD); Case/Package: 0805
footprint C 0805
pins: 1 B, 2 A
